# Altium footprint library Connectors.PcbLib: 131 footprints (part 3 of 9)
Each footprint in its own frame and in the unit in brackets; x right, y up, seen from the top. Pads: shape width x height; smd on the part's side, far side on the other; paste and mask are expansions set on the pad; w line width, h text height; cw(c..) or ccw(c..) is an arc to the next point about the centre after c.
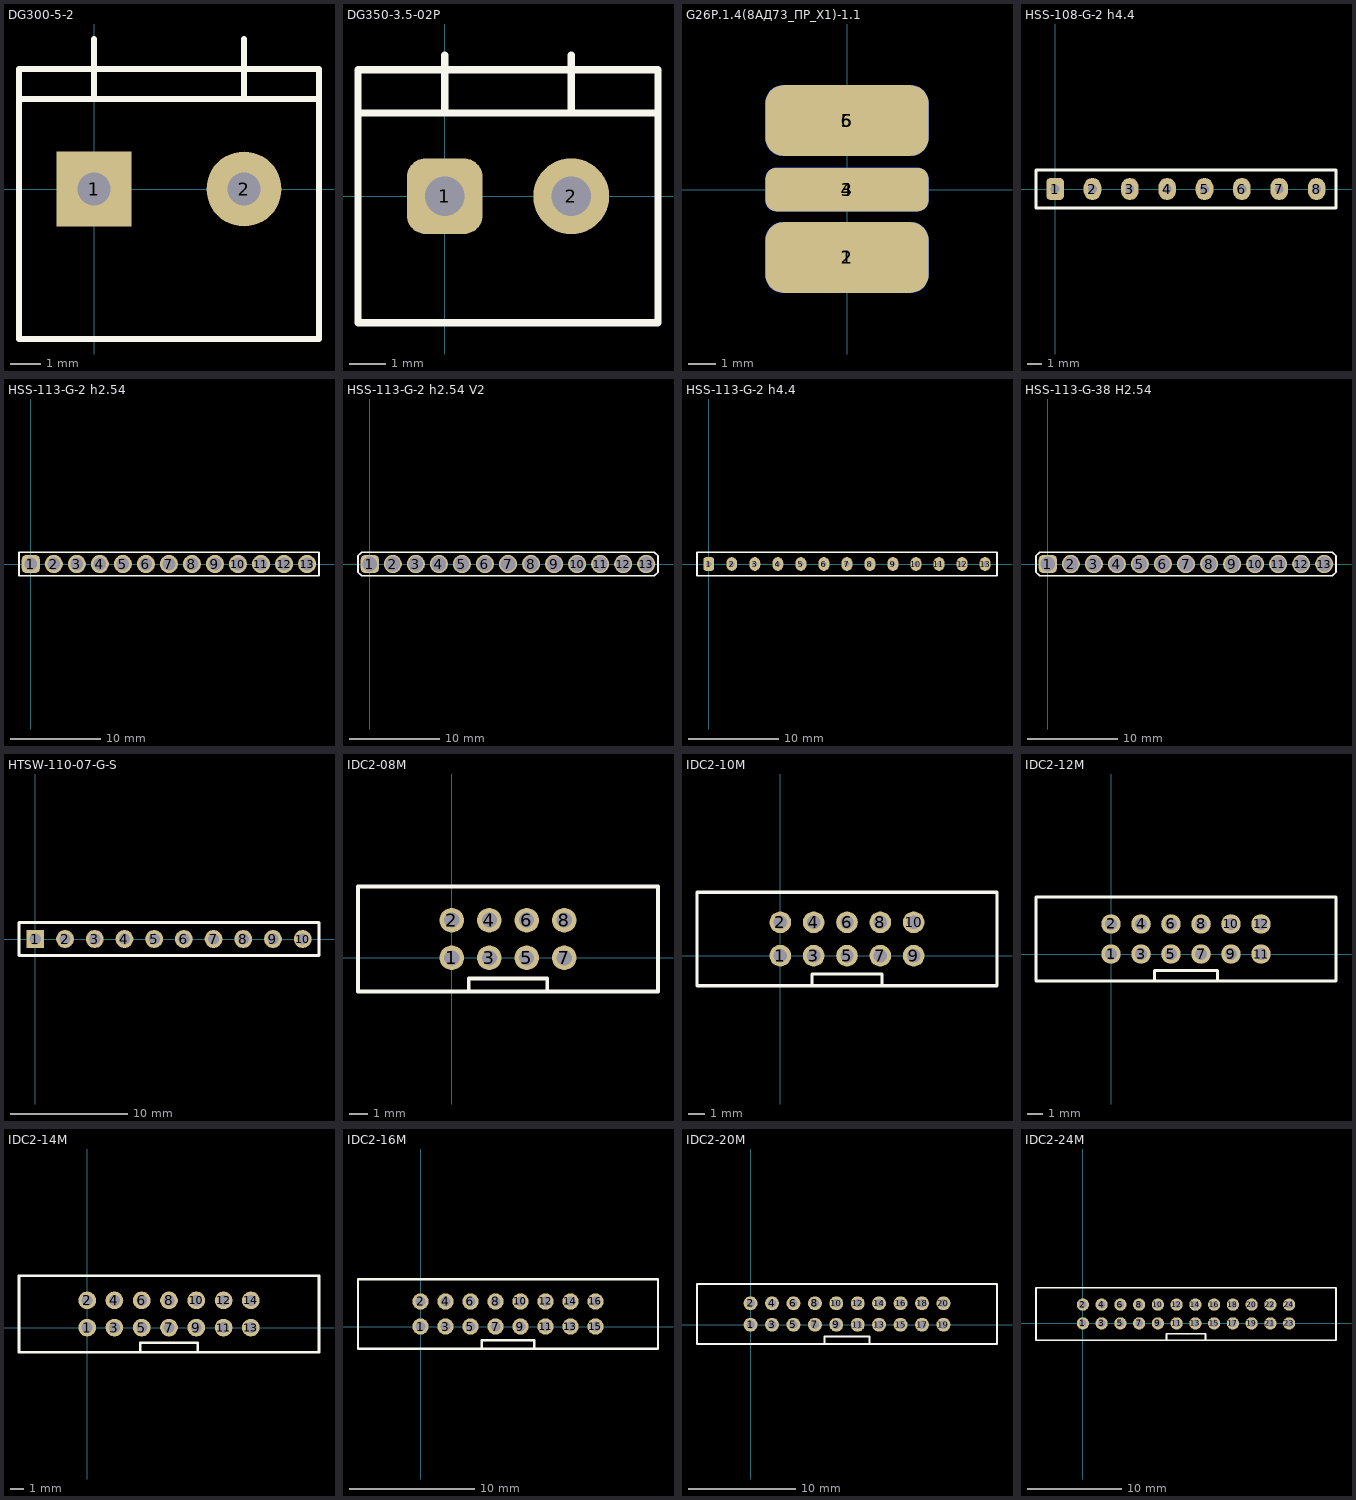
[diagram p2: the footprints below, top view; thin cyan lines are the x and y axes]

## DG300-5-2 [mm]
pads (2):
  rect 2.5x2.5 hole 1.1: 1(0,0)
  round 2.5 hole 1.1: 2(5,0)
Top Overlay:
  lines w0.2: -2.5,3 7.5,3 ; 0,3.048 0,5 ; 5,3 5,5
  lines w0.203: -2.5,-5 7.5,-5 7.5,4 -2.5,4 -2.5,-5
3D body "User Library-DG300-5_0-02P-12.STEP": height 12.6, standoff -4.4, extent -2.502,-5.027 7.498,3.973

## DG350-3.5-02P [mm]
pads (2):
  rrect50% 2.1x2.1 hole 1.1: 1(0,0)
  round 2.1 hole 1.1: 2(3.5,0)
Top Overlay:
  lines w0.2: -2.4,2.3 5.9,2.3 ; 0,2.3 0,3.9 ; 3.5,2.3 3.5,3.9
  lines w0.203: -2.4,-3.5 5.9,-3.5 5.9,3.5 -2.4,3.5 -2.4,-3.5
3D body "User Library-DG350-3,5-02P.STEP": height 8.4, standoff -3.4, extent -2.25,-3.4 5.75,3.4

## G26P.1.4(8АД73_ПР_Х1)-1.1 [mm]
pads (6):
  rrect50% 6x2.6 smd: 1(0,-2.5) 5(0,2.54)
  rrect50% 6x2.6 smd far side: 2(0,-2.5) 6(0,2.54)
  rrect50% 6x1.6 smd: 3(0,0)
  rrect50% 6x1.6 smd far side: 4(0,0)
Top Assembly:
  text ".Designator" at -4.998,-0.333 h1
3D body "G26P.1.4(8АД73_ПР_Х1)-1.1.step": height 6.43, standoff -9.22, extent -9.899,-8.426 -0.323,8.573

## HSS-108-G-2 h4.4 [mm]
height 4.4
pads (8):
  rrect50% 1.2x1.5 hole 0.6: 1(0,0)
  oval 1.2x1.5 hole 0.6: 2(2.54,0) 3(5.08,0) 4(7.62,0) 5(10.16,0) 6(12.7,0) 7(15.24,0) 8(17.78,0)
Top Overlay:
  lines w0.2: -1.3,-1.3 -1.3,1.3 19.1,1.3 19.1,-1.3 -1.3,-1.3
Top Assembly:
  text ".Designator" at 4.002,-0.333 h1
3D body "Samtec-HSS-18-G-2.step": height 4.44, standoff -3.18, extent -1.27,-1.27 19.05,1.27

## HSS-113-G-2 h2.54 [mm]
height 2.54
pads (13):
  rrect50% 2x2 hole 1.4: 1(0,0)
  round 2 hole 1.4: 2(2.54,0) 3(5.08,0) 4(7.62,0) 5(10.16,0) 6(12.7,0) 7(15.24,0) 8(17.78,0) 9(20.32,0) 10(22.86,0) 11(25.4,0) 12(27.94,0) 13(30.48,0)
Top Overlay:
  lines w0.2: -1.3,-1.3 31.8,-1.3 31.8,1.3 -1.3,1.3 -1.3,-1.3
Top Assembly:
  text ".Designator" at 10.242,-0.333 h1
3D body "Samtec-HSS-113-G-2.step": height 2.54, standoff -5.08, extent -1.27,-1.27 31.75,1.27

## HSS-113-G-2 h2.54 V2 [mm]
height 2.54
pads (13):
  rrect50% 2x2 hole 1.6: 1(0,0)
  round 2 hole 1.6: 2(2.54,0) 3(5.08,0) 4(7.62,0) 5(10.16,0) 6(12.7,0) 7(15.24,0) 8(17.78,0) 9(20.32,0) 10(22.86,0) 11(25.4,0) 12(27.94,0) 13(30.48,0)
Top Overlay:
  lines w0.2: -1.3,-0.9 -1.3,0.9 -0.9,1.3 31.38,1.3 31.78,0.9 31.78,-0.9 31.38,-1.3 -0.9,-1.3 -1.3,-0.9
Top Assembly:
  text ".Designator" at 10.242,-0.333 h1
3D body "Samtec-HSS-113-G-2.step": height 2.54, standoff -5.08, extent -1.27,-1.27 31.75,1.27

## HSS-113-G-2 h4.4 [mm]
height 4.4
pads (13):
  rrect50% 1.2x1.5 hole 0.6: 1(0,0)
  oval 1.2x1.5 hole 0.6: 2(2.54,0) 3(5.08,0) 4(7.62,0) 5(10.16,0) 6(12.7,0) 7(15.24,0) 8(17.78,0) 9(20.32,0) 10(22.86,0) 11(25.4,0) 12(27.94,0) 13(30.48,0)
Top Overlay:
  lines w0.2: -1.3,-1.3 -1.3,1.3 31.8,1.3 31.8,-1.3 -1.3,-1.3
Top Assembly:
  text ".Designator" at 10.242,-0.333 h1
3D body "Samtec-HSS-113-G-2.step": height 4.44, standoff -3.18, extent -1.27,-1.27 31.75,1.27

## HSS-113-G-38 H2.54 [mm]
height 2.54
pads (13):
  rrect50% 2x2 hole 1.6: 1(0,0)
  round 2 hole 1.6: 2(2.54,0) 3(5.08,0) 4(7.62,0) 5(10.16,0) 6(12.7,0) 7(15.24,0) 8(17.78,0) 9(20.32,0) 10(22.86,0) 11(25.4,0) 12(27.94,0) 13(30.48,0)
Top Overlay:
  lines w0.2: -1.3,-0.9 -0.9,-1.3 31.38,-1.3 31.78,-0.9 31.78,0.9 31.38,1.3 -0.9,1.3 -1.3,0.9 -1.3,-0.9
Top Assembly:
  text ".Designator" at 10.242,-0.333 h1
3D body "Samtec-HSS-113-G-38.step": height 2.56, standoff -6.33, extent -1.275,-1.27 31.745,1.27

## HTSW-110-07-G-S [mil]
pads (10):
  rect 60x60 hole 38: 1(0,0)
  round 60 hole 38: 2(100,0) 3(200,0) 4(300,0) 5(400,0) 6(500,0) 7(600,0) 8(700,0) 9(800,0) 10(900,0)
Top Overlay:
  lines w10: -55,-55 955,-55 955,55 -55,55 -55,-55
Top Assembly:
  text ".Designator" at 255.97,-13.12 h39.37
3D body "HTSW-110-07-G-S.stp": height 330, standoff -100, extent -50.2,-49 949.8,49

## IDC2-08M [mm]
pads (8):
  round 1.3 hole 0.8: 1(0,0) 2(0,2) 3(2,0) 4(2,2) 5(4,0) 6(4,2) 7(6,0) 8(6,2)
Top Overlay:
  lines w0.2: 0.9,-1.8 0.9,-1.1 5.1,-1.1 5.1,-1.8 ; -5,-1.8 11,-1.8 11,3.8 -5,3.8 -5,-1.8
Top Assembly:
  text ".Designator" at 7.998,0.757 h1
3D body "159X08-6012.stp": height 5.39, standoff -2.79, extent -2.175,-1.977 8.174,4.157

## IDC2-10M [mm]
pads (10):
  round 1.3 hole 0.8: 1(0,0) 2(0,2) 3(2,0) 4(2,2) 5(4,0) 6(4,2) 7(6,0) 8(6,2) 9(8,0) 10(8,2)
Top Overlay:
  lines w0.2: 1.9,-1.8 1.9,-1.1 6.1,-1.1 6.1,-1.8 ; -5,-1.8 -5,3.8 13,3.8 13,-1.8 -5,-1.8
Top Assembly:
  text ".Designator" at 8.998,0.667 h1
3D body "957210-6002-AR.stp": height 5.65, standoff -3, extent -4.6,-1.75 12.6,3.75

## IDC2-12M [mm]
pads (12):
  round 1.3 hole 0.8: 1(0,0) 2(0,2) 3(2,0) 4(2,2) 5(4,0) 6(4,2) 7(6,0) 8(6,2) 9(8,0) 10(8,2) 11(10,0) 12(10,2)
Top Overlay:
  lines w0.2: 2.9,-1.8 2.9,-1.1 7.1,-1.1 7.1,-1.8 ; -5,-1.8 15,-1.8 15,3.8 -5,3.8 -5,-1.8
Top Assembly:
  text ".Designator" at 9.998,0.667 h1
3D body "957212-6002-AR.stp": height 5.67, standoff -2.98, extent -4.6,-1.75 14.6,3.75

## IDC2-14M [mm]
pads (14):
  round 1.3 hole 0.8: 1(0,0) 2(0,2) 3(2,0) 4(2,2) 5(4,0) 6(4,2) 7(6,0) 8(6,2) 9(8,0) 10(8,2) 11(10,0) 12(10,2) 13(12,0) 14(12,2)
Top Overlay:
  lines w0.2: 3.9,-1.8 3.9,-1.1 8.1,-1.1 8.1,-1.8 ; -5,-1.8 17,-1.8 17,3.8 -5,3.8 -5,-1.8
Top Assembly:
  text ".Designator" at 10.998,0.667 h1
3D body "957214-6002-AR.stp": height 5.67, standoff -2.98, extent -4.6,-1.75 16.6,3.75

## IDC2-16M [mm]
pads (16):
  round 1.3 hole 0.8: 1(0,0) 2(0,2) 3(2,0) 4(2,2) 5(4,0) 6(4,2) 7(6,0) 8(6,2) 9(8,0) 10(8,2) 11(10,0) 12(10,2) 13(12,0) 14(12,2) 15(14,0) 16(14,2)
Top Overlay:
  lines w0.2: 4.9,-1.8 4.9,-1.1 9.1,-1.1 9.1,-1.8 ; -5,-1.8 19,-1.8 19,3.8 -5,3.8 -5,-1.8
Top Assembly:
  text ".Designator" at 11.998,0.667 h1

## IDC2-20M [mm]
pads (20):
  round 1.3 hole 0.8: 1(0,0) 2(0,2) 3(2,0) 4(2,2) 5(4,0) 6(4,2) 7(6,0) 8(6,2) 9(8,0) 10(8,2) 11(10,0) 12(10,2) 13(12,0) 14(12,2) 15(14,0) 16(14,2) 17(16,0) 18(16,2) 19(18,0) 20(18,2)
Top Overlay:
  lines w0.2: 6.9,-1.8 6.9,-1.1 11.1,-1.1 11.1,-1.8 ; -5,-1.8 -5,3.8 23,3.8 23,-1.8 -5,-1.8
Top Assembly:
  text ".Designator" at 13.998,0.667 h1

## IDC2-24M [mm]
pads (24):
  round 1.3 hole 0.8: 1(0,0) 2(0,2) 3(2,0) 4(2,2) 5(4,0) 6(4,2) 7(6,0) 8(6,2) 9(8,0) 10(8,2) 11(10,0) 12(10,2) 13(12,0) 14(12,2) 15(14,0) 16(14,2) 17(16,0) 18(16,2) 19(18,0) 20(18,2) 21(20,0) 22(20,2) 23(22,0) 24(22,2)
Top Overlay:
  lines w0.2: 8.9,-1.8 8.9,-1.1 13.1,-1.1 13.1,-1.8 ; -5,-1.8 27,-1.8 27,3.8 -5,3.8 -5,-1.8
Top Assembly:
  text ".Designator" at 15.998,0.667 h1